# Altium footprint library PCB2-v2.PcbLib: 29 footprints (part 1 of 2)
Each footprint in its own frame and in the unit in brackets; x right, y up, seen from the top. Pads: shape width x height; smd on the part's side, far side on the other; paste and mask are expansions set on the pad; w line width, h text height; cw(c..) or ccw(c..) is an arc to the next point about the centre after c.
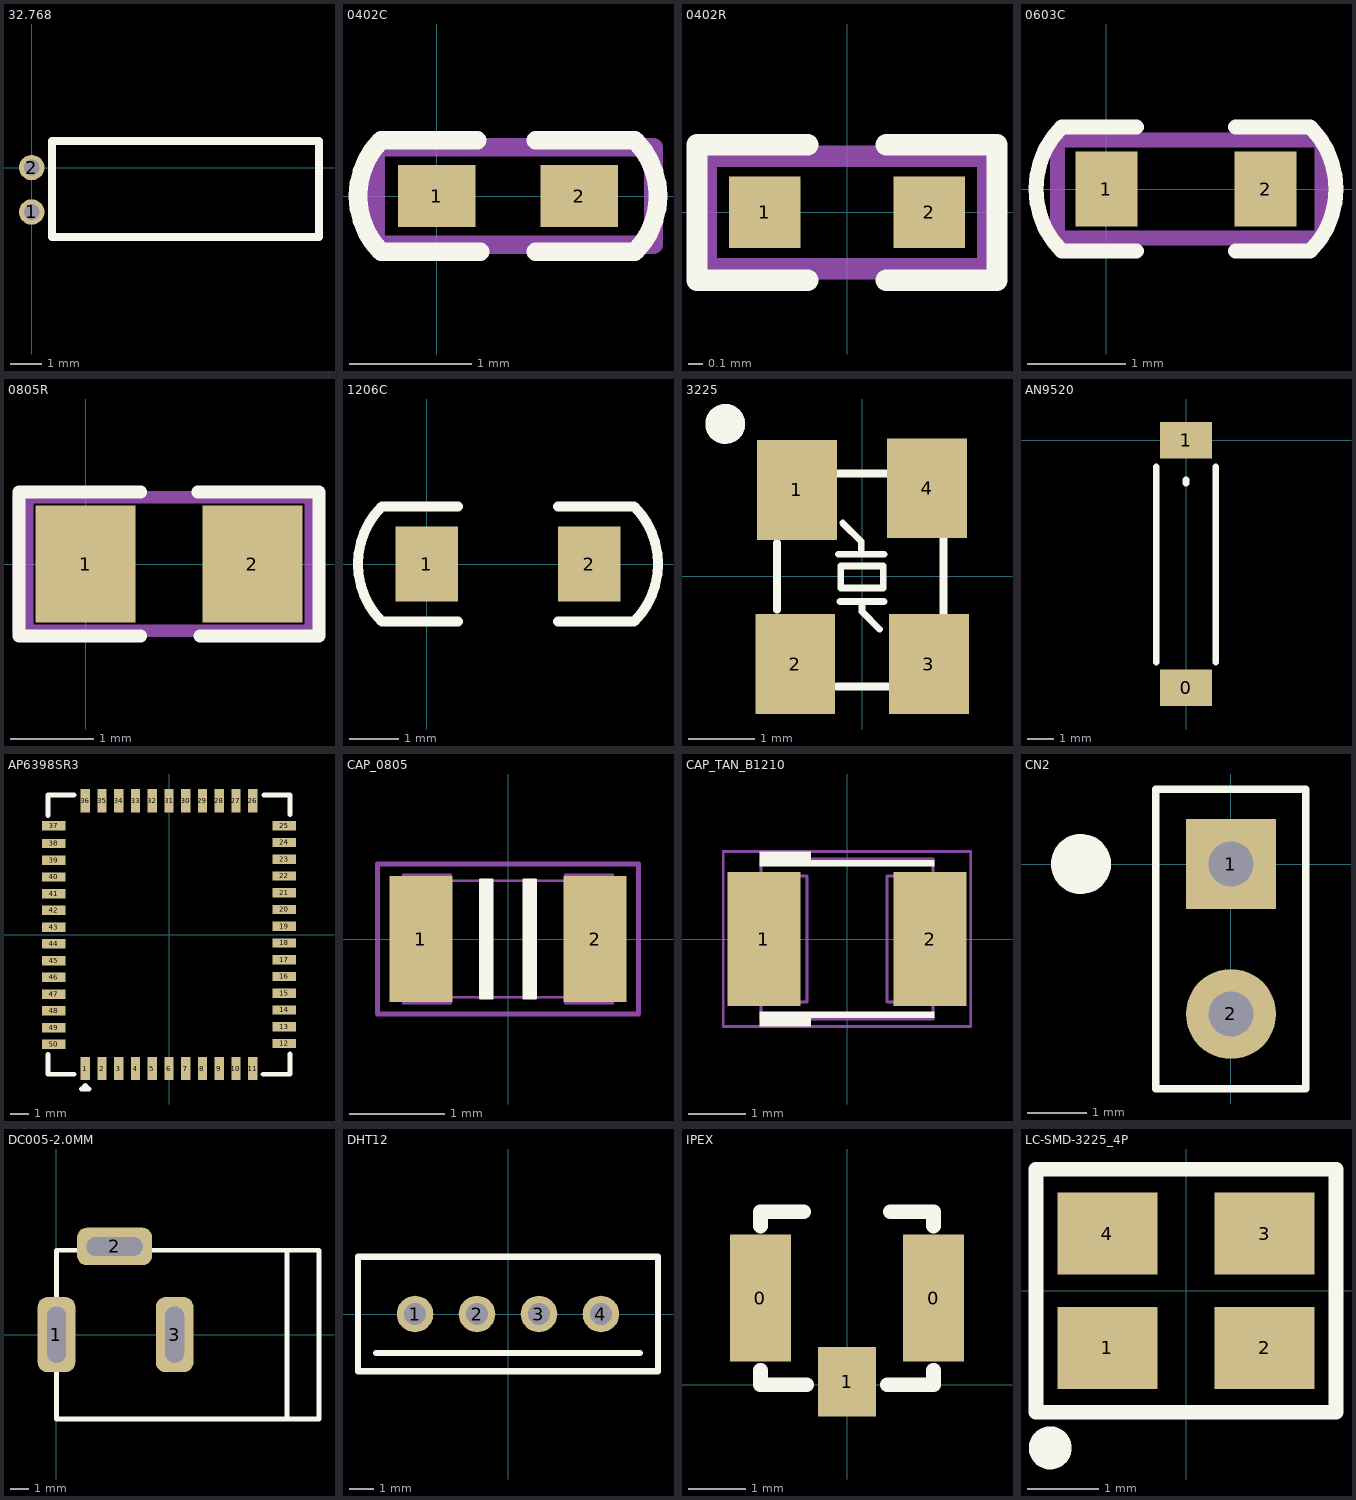
[diagram p0: the footprints below, top view; thin cyan lines are the x and y axes]

## 32.768 [mm]
pads (2):
  round 0.8 hole 0.5: 1(0,-1.397) 2(0,0)
Top Overlay:
  lines w0.254: 0.635,-2.184 9.042,-2.184 9.042,0.838 0.635,0.838 0.635,-2.184
3D body: height 3, standoff 0, extent 0.912,-2.198 8.912,0.79

## 0402C [mil]
pads (2):
  rect 25x20 smd: 1(0,0) 2(46,0)
Top Overlay:
  lines w6: -18,-18 cw(c0,0) -18,18 13,18 ; -17,-18 14,-18 ; 32,-18 64,-18 ccw(c46,0) 64,18 32,18
Mechanical 13:
  lines w6: -20,-15.75 -20,15.75 70,15.75 70,-15.75 -20,-15.75
Mechanical 15:
  lines w6: -19.68,-15.75 70,-15.75 70,15.75 -19.68,15.75 -19.68,-15.75
3D body: height 7.95, standoff 0, extent 3.94,-11.81 43.31,11.81

## 0402R [mil]
pads (2):
  rect 20x20 smd: 1(-23,0) 2(23,0)
Top Overlay:
  lines w6: -11,-19 -42,-19 -42,19 -11,19 ; 11,-19 42,-19 42,19 11,19
Mechanical 13:
  lines w6: -39.37,-15.75 39.37,-15.75 39.37,15.75 -39.37,15.75 -39.37,-15.75
Mechanical 15:
  lines w6: -39.37,-15.75 -39.37,15.75 39.37,15.75 39.37,-15.75 -39.37,-15.75
3D body: height 16.14, standoff 0, extent -22.63,-10.82 22.64,10.83

## 0603C [mil]
pads (2):
  rect 25x30 smd: 1(0,0) 2(64,0)
Top Overlay:
  lines w6: 12,-25 -18,-25 cw(c7,0) -18,25 12,25 ; 52,-25 82,-25 ccw(c57,0) 82,25 52,25
Mechanical 13:
  lines w6: -19.68,-19.68 86.61,-19.68 86.61,19.68 -19.68,19.68 -19.68,-19.68
Mechanical 15:
  lines w6: -19.68,-19.68 -19.68,19.68 86.61,19.68 86.61,-19.68 -19.68,-19.68
3D body: height 11.89, standoff 0, extent 0,-15.75 62.99,15.75

## 0805R [mm]
pads (2):
  rect 1.2x1.4 smd: 1(0,0) 2(2,0)
Top Overlay:
  lines w0.152: 0.66,-0.864 -0.8,-0.864 -0.8,0.864 0.66,0.864 ; 1.346,0.864 2.8,0.864 2.8,-0.864 1.372,-0.864
Mechanical 13:
  lines w0.152: -0.7,-0.8 -0.7,0.8 2.7,0.8 2.7,-0.8 -0.7,-0.8
Mechanical 15:
  lines w0.152: -0.8,-0.8 2.7,-0.8 2.7,0.8 -0.8,0.8 -0.8,-0.8
3D body: height 0.77, standoff -0.01, extent 0,-0.625 2,0.625

## 1206C [mil]
pads (2):
  rect 50x60 smd: 1(0,0) 2(130,0)
Top Overlay:
  lines w8: 25,-46 -36,-46 cw(c10,0) -36,46 25,46 ; 105,-46 166,-46 ccw(c120,0) 166,46 105,46

## 3225 [mm]
pads (4):
  rect 1.2x1.5 smd: 1(-0.978,1.295) 2(-1.003,-1.321) 3(1.003,-1.321) 4(0.978,1.321)
Top Overlay:
  circle w0.3: c-2.055,2.286 r0.15
  lines w0.1: -0.356,0.33 0.33,0.33 ; -0.33,-0.381 0.33,-0.381 ; -0.292,0.8 -0.013,0.521 -0.013,0.33 ; 0,-0.381 0,-0.533 0.267,-0.8 ; -0.318,-0.178 -0.318,0.152 0.318,0.152 0.318,-0.178 -0.318,-0.178
  lines w0.12: -1.278,-0.505 -1.278,0.495 ; -0.378,-1.655 0.422,-1.655 ; -0.378,1.545 0.422,1.545 ; 1.222,-0.605 1.222,0.595
3D body: height 0.8, standoff 0, extent -1.268,-1.651 1.232,1.549

## AN9520 [mm]
pads (2):
  rect 2x1.4 smd: 0(0,-9.5) 1(0,0)
Top Overlay:
  lines w0.254: -1.143,-8.509 -1.143,-1.016 ; 0,-1.651 0,-1.524 ; 1.143,-8.509 1.143,-1.016
3D body: height 1, standoff 0, extent -1.143,-9.525 1.143,0

## AP6398SR3 [mm] "ap6398sr3"
height 1.5
pads (50):
  rect 0.5x1.25 smd: 1(-4.5,-7.2) 2(-3.6,-7.2) 3(-2.7,-7.2) 4(-1.8,-7.2) 5(-0.9,-7.2) 6(0,-7.2) 7(0.9,-7.2) 8(1.8,-7.2) 9(2.7,-7.2) 10(3.6,-7.2) 11(4.5,-7.2) 26(4.5,7.2) 27(3.6,7.2) 28(2.7,7.2) 29(1.8,7.2) 30(0.9,7.2) 31(0,7.2) 32(-0.9,7.2) 33(-1.8,7.2) 34(-2.7,7.2) 35(-3.6,7.2) 36(-4.5,7.2)
  rect 1.25x0.5 smd: 12(6.188,-5.85) 13(6.188,-4.95) 14(6.188,-4.05) 15(6.188,-3.15) 16(6.188,-2.25) 17(6.188,-1.35) 18(6.188,-0.45) 19(6.188,0.45) 20(6.188,1.35) 21(6.188,2.25) 22(6.188,3.15) 23(6.188,4.05) 24(6.188,4.95) 25(6.188,5.85) 37(-6.188,5.85) 38(-6.188,4.9) 39(-6.188,4) 40(-6.188,3.1) 41(-6.188,2.2) 42(-6.188,1.3) 43(-6.188,0.4) 44(-6.188,-0.5) 45(-6.188,-1.4) 46(-6.188,-2.3) 47(-6.188,-3.2) 48(-6.188,-4.1) 49(-6.188,-5) 50(-6.188,-5.9)
Top Overlay:
  lines w0.254: -6.5,-6.45 -6.5,-7.5 ; -6.5,6.4 -6.5,7.5 ; -5.1,-7.5 -6.5,-7.5 ; -5.1,7.5 -6.5,7.5 ; 5.05,-7.5 6.5,-7.5 ; 5.1,7.5 6.5,7.5 ; 6.5,-6.4 6.5,-7.5 ; 6.5,6.45 6.5,7.5 ; -6.5,-7.5 -6.5,-7.5 ; -6.5,7.5 -6.5,7.5 ; 6.5,-7.5 6.5,-7.5 ; 6.5,7.5 6.5,7.5 ; -4.7,-8.3 -4.5,-8.1 -4.3,-8.3 -4.7,-8.3
3D body: height 1.5, standoff 0, extent -6.5,-7.5 6.5,7.5

## CAP_0805 [mil]
height 47.24
pads (2):
  rect 26x52 smd: 1(-36,0) 2(36,0)
Top Overlay:
  region: 11.5,-24.5 6.5,-24.5 6.5,24.5 11.5,24.5
  region: -11.5,24.5 -6.5,24.5 -6.5,-24.5 -11.5,-24.5
  lines w1: -11.5,-24.5 -11.5,24.5 -6.5,24.5 -6.5,-24.5 -11.5,-24.5 ; 6.5,-24.5 11.5,-24.5 11.5,24.5 6.5,24.5 6.5,-24.5
Mechanical 13:
  lines w1: -23.62,-24 23.62,-24 ; -23.62,24 23.62,24 ; -43.31,-26.57 -23.62,-26.57 -23.62,26.57 -43.31,26.57 -43.31,-26.57 ; 23.62,-26.57 23.62,26.57 43.31,26.57 43.31,-26.57 23.62,-26.57
Mechanical 14:
  lines w2: -54,-31 -54,31 54,31 54,-31 -54,-31
3D body: height 50, standoff 0, extent -39.37,-23.62 39.37,23.62

## CAP_TAN_B1210 [mil]
height 82.68
pads (2):
  rect 50x92 smd: 1(-57,0) 2(57,0)
Top Overlay:
  region: 60,50 -60,50 -60,60 -25,60 -25,54 60,54
  region: 60,-54 -25,-54 -25,-60 -60,-60 -60,-50 60,-50
Mechanical 13:
  lines w2: -68.89,-43.3 -27.55,-43.3 -27.55,43.31 -68.89,43.31 -68.89,-43.3 ; -59.06,-55.11 -59.06,55.12 59.05,55.12 59.05,-55.11 -59.06,-55.11 ; 27.56,-43.31 27.56,43.31 68.9,43.31 68.9,-43.31 27.56,-43.31
Mechanical 14:
  lines w2: -85,-60 85,-60 85,60 -85,60 -85,-60
3D body: height 82.68, standoff 0, extent -68.89,-55.11 68.9,55.12

## CN2 [mil] "Header 2 X 1"
pads (2):
  rect 60x60 hole 30: 1(0,0)
  round 60 hole 30: 2(0,-100)
Top Overlay:
  circle w20: c-100,0 r10
  lines w5: -50,-150 50,-150 50,50 -50,50 -50,-150

## DC005-2.0MM [mm] "DC005-2.0"
pads (3):
  rrect50% 2x4 hole 3 slot 1 at 0 deg: 1(0,0) 3(6.3,0)
  rrect50% 4x2 hole 3 slot 1 at 90 deg: 2(3.1,4.7)
Top Overlay:
  lines w0.254: 12.3,-4.5 12.3,4.5 ; 0,-4.5 14,-4.5 14,4.5 0,4.5 0,-4.5

## DHT12 [mm]
pads (4):
  round 1.5 hole 0.9: 1(-3.81,0) 2(-1.27,0) 3(1.27,0) 4(3.81,0)
Top Overlay:
  lines w0.254: -5.4,-1.6 5.4,-1.6 ; -6.15,-2.35 -6.15,2.35 6.15,2.35 6.15,-2.35 -6.15,-2.35
3D body: height 7.5, standoff 0, extent -6.2,-2.4 6.2,2.4

## IPEX [mm]
pads (3):
  rect 1.05x2.2 smd: 0(-1.5,1.5) 0(1.5,1.5)
  rect 1x1.2 smd: 1(0,0.05)
Top Overlay:
  lines w0.254: -1.5,0.25 -1.5,0 -0.7,0 ; -1.5,2.75 -1.5,3 -0.75,3 ; 0.7,0 1.5,0 1.5,0.25 ; 0.75,3 1.5,3 1.5,2.75
3D body: height 1, standoff 0.5, extent -0.992,0.526 1,2.522
3D body: height 0.5, standoff 0, extent -1.524,0 1.524,3.048

## LC-SMD-3225_4P [mm]
pads (4):
  rect 1.4x1.15 smd: 1(-1.1,-0.8) 2(1.1,-0.8) 3(1.1,0.8) 4(-1.1,0.8)
Top Overlay:
  circle w0.3: c-1.9,-2.2 r0.15
  lines w0.203: -2.1,-1.7 -2.1,1.7 2.1,1.7 2.1,-1.7 -2.1,-1.7
3D body: height 0.61, standoff 0, extent -1.6,-1.25 1.6,1.25